# Altium footprint library bluepill.PcbLib: 1 footprints
Each footprint in its own frame and in the unit in brackets; x right, y up, seen from the top. Pads: shape width x height; smd on the part's side, far side on the other; paste and mask are expansions set on the pad; w line width, h text height; cw(c..) or ccw(c..) is an arc to the next point about the centre after c.
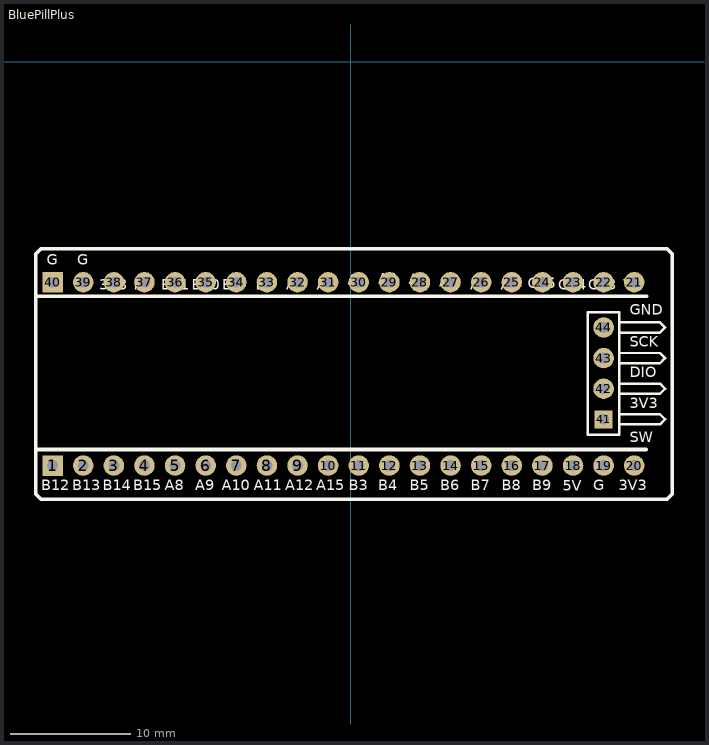
[diagram p0: the footprint, top view; thin cyan lines are the x and y axes]

## BluePillPlus [mm]
height 0.254
pads (44):
  rect 1.7x1.7 hole 0.9: 1(-24.727,-33.49) 40(-24.727,-18.275)
  round 1.7 hole 0.9: 2(-22.187,-33.49) 3(-19.647,-33.49) 4(-17.107,-33.49) 5(-14.567,-33.49) 6(-12.027,-33.49) 7(-9.487,-33.49) 8(-6.947,-33.49) 9(-4.407,-33.49) 10(-1.867,-33.49) 11(0.673,-33.49) 12(3.213,-33.49) 13(5.753,-33.49) 14(8.293,-33.49) 15(10.833,-33.49) 16(13.373,-33.49) 17(15.913,-33.49) 18(18.453,-33.49) 19(20.993,-33.49) 20(23.533,-33.49) 21(23.533,-18.275) 22(20.993,-18.275) 23(18.453,-18.275) 24(15.913,-18.275) 25(13.373,-18.275) 26(10.833,-18.275) 27(8.293,-18.275) 28(5.753,-18.275) 29(3.213,-18.275) 30(0.673,-18.275) 31(-1.867,-18.275) 32(-4.407,-18.275) 33(-6.947,-18.275) 34(-9.487,-18.275) 35(-12.027,-18.275) 36(-14.567,-18.275) 37(-17.107,-18.275) 38(-19.647,-18.275) 39(-22.187,-18.275) 42(20.993,-27.114) 43(20.993,-24.575) 44(20.993,-22.034)
  rect 1.5x1.5 hole 0.9: 41(20.993,-29.654)
Top Overlay:
  lines w0.2: 22.288,-30.078 25.675,-30.078 26.098,-29.654 25.675,-29.231 22.288,-29.231 ; 22.288,-27.538 25.675,-27.538 26.098,-27.114 25.675,-26.691 22.288,-26.691 ; 22.288,-24.998 25.675,-24.998 26.098,-24.575 25.675,-24.151 22.288,-24.151 ; 22.288,-22.458 25.675,-22.458 26.098,-22.034 25.675,-21.611 22.288,-21.611 ; 19.685,-30.924 19.685,-20.764 22.288,-20.764 22.288,-30.924 19.685,-30.924
  lines w0.3: -26.048,-32.156 24.524,-32.156 ; -26.048,-19.456 24.549,-19.456
  lines w0.305: -26.124,-35.852 -26.124,-15.938 -25.691,-15.505 26.25,-15.505 26.683,-15.938 26.683,-35.852 26.251,-36.284 -25.692,-36.284 -26.124,-35.852
  text "G" at -25.222,-17.12 h1.52
  text "A7" at -5.334,-19.177 h1.52
  text "A3" at 4.826,-18.745 h1.52
  text "G" at -22.682,-17.12 h1.52
  text "B0" at -7.874,-19.177 h1.52
  text "C14" at 17.221,-19.177 h1.52
  text "A1" at 9.906,-19.177 h1.52
  text "C13" at 19.736,-19.177 h1.52
  text "A5" at -0.254,-18.796 h1.52
  text "A2" at 7.366,-18.948 h1.52
  text "3V3" at -20.853,-19.177 h1.52
  text "A0" at 12.446,-19.177 h1.52
  text "A4" at 2.286,-18.694 h1.52
  text "B1" at -10.643,-19.177 h1.52
  text "R" at -18.009,-19.177 h1.52
  text "B11" at -15.723,-19.177 h1.52
  text "A6" at -2.794,-19.177 h1.52
  text "VB" at 22.606,-19.177 h1.52
  text "B10" at -13.183,-19.177 h1.52
  text "C15" at 14.681,-19.075 h1.52
  text "DIO" at 23.177,-26.463 h1.52
  text "GND" at 23.177,-21.273 h1.52
  text "SCK" at 23.177,-23.931 h1.52
  text "3V3" at 23.177,-29.019 h1.52
  text "SW" at 23.177,-31.839 h1.52
  text "A8" at -15.418,-35.832 h1.52
  text "B7" at 9.982,-35.811 h1.52
  text "B13" at -23.114,-35.832 h1.52
  text "A10" at -10.693,-35.832 h1.52
  text "A11" at -8.026,-35.814 h1.52
  text "B9" at 15.062,-35.832 h1.52
  text "B14" at -20.574,-35.814 h1.52
  text "A12" at -5.436,-35.814 h1.52
  text "B12" at -25.654,-35.814 h1.52
  text "B6" at 7.442,-35.832 h1.52
  text "B4" at 2.286,-35.814 h1.52
  text "G" at 20.142,-35.845 h1.52
  text "A9" at -12.878,-35.832 h1.52
  text "B3" at -0.152,-35.832 h1.52
  text "3V3" at 22.25,-35.832 h1.52
  text "A15" at -2.845,-35.832 h1.52
  text "B5" at 4.902,-35.829 h1.52
  text "B8" at 12.522,-35.832 h1.52
  text "5V" at 17.602,-35.854 h1.52
  text "B15" at -18.034,-35.832 h1.52
Bottom Overlay:
  lines w0.2: -25.997,-35.827 -25.997,-32.22 -24.092,-32.22 24.803,-32.22 24.803,-36.157 ; -25.997,-15.837 -25.997,-19.545 24.803,-19.545 24.803,-15.608
3D body "YAAJ_BluePill.step": height 12.88, standoff 0.38, extent -27.135,-37.078 25.865,-14.478